# Altium footprint library footprints.PcbLib: 33 footprints (part 3 of 3)
Each footprint in its own frame and in the unit in brackets; x right, y up, seen from the top. Pads: shape width x height; smd on the part's side, far side on the other; paste and mask are expansions set on the pad; w line width, h text height; cw(c..) or ccw(c..) is an arc to the next point about the centre after c.
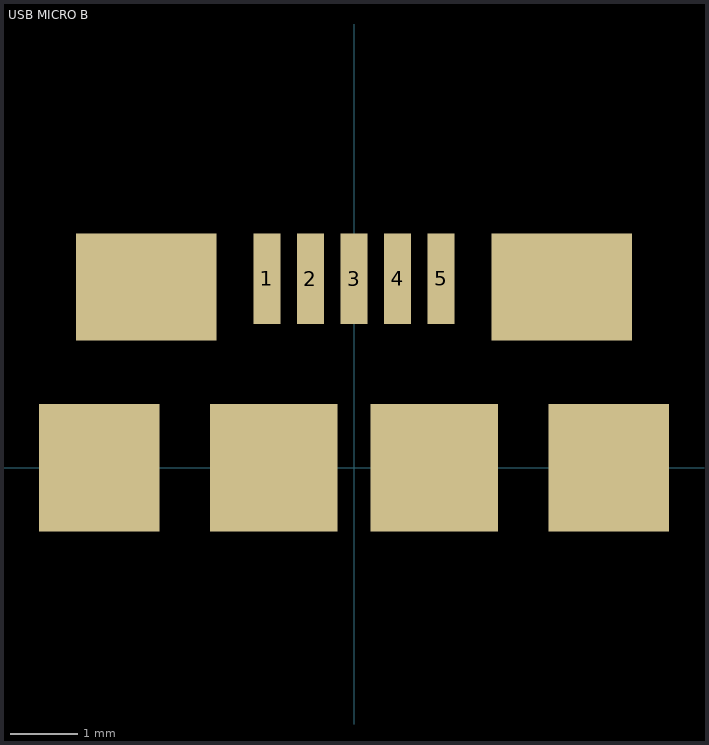
[diagram p2: the footprint, top view; thin cyan lines are the x and y axes]

## USB MICRO B [mm] "USB MICRO B SMT"
pads (11):
  rect 0.4x1.35 smd: 1(-1.3,2.825) 2(-0.65,2.825) 3(0,2.825) 4(0.65,2.825) 5(1.3,2.825)
  rect 1.8x1.9 smd: ""(-3.8,0) ""(3.8,0)
  rect 2.1x1.6 smd: ""(-3.1,2.7) ""(3.1,2.7)
  rect 1.9x1.9 smd: ""(-1.2,0) ""(1.2,0)
3D body: height 0.25, standoff 0, extent 0,0 0,0
3D body: height 0.25, standoff 0, extent 0,0 0,0
3D body: height 0.25, standoff 0, extent 0,0 0,0
3D body "USB B micro.stp": height 2.72, standoff -0.29, extent -3.956,-2.667 3.956,2.994